# Altium footprint library North POLE.PcbLib: 419 footprints (part 7 of 27)
Each footprint in its own frame and in the unit in brackets; x right, y up, seen from the top. Pads: shape width x height; smd on the part's side, far side on the other; paste and mask are expansions set on the pad; w line width, h text height; cw(c..) or ccw(c..) is an arc to the next point about the centre after c.
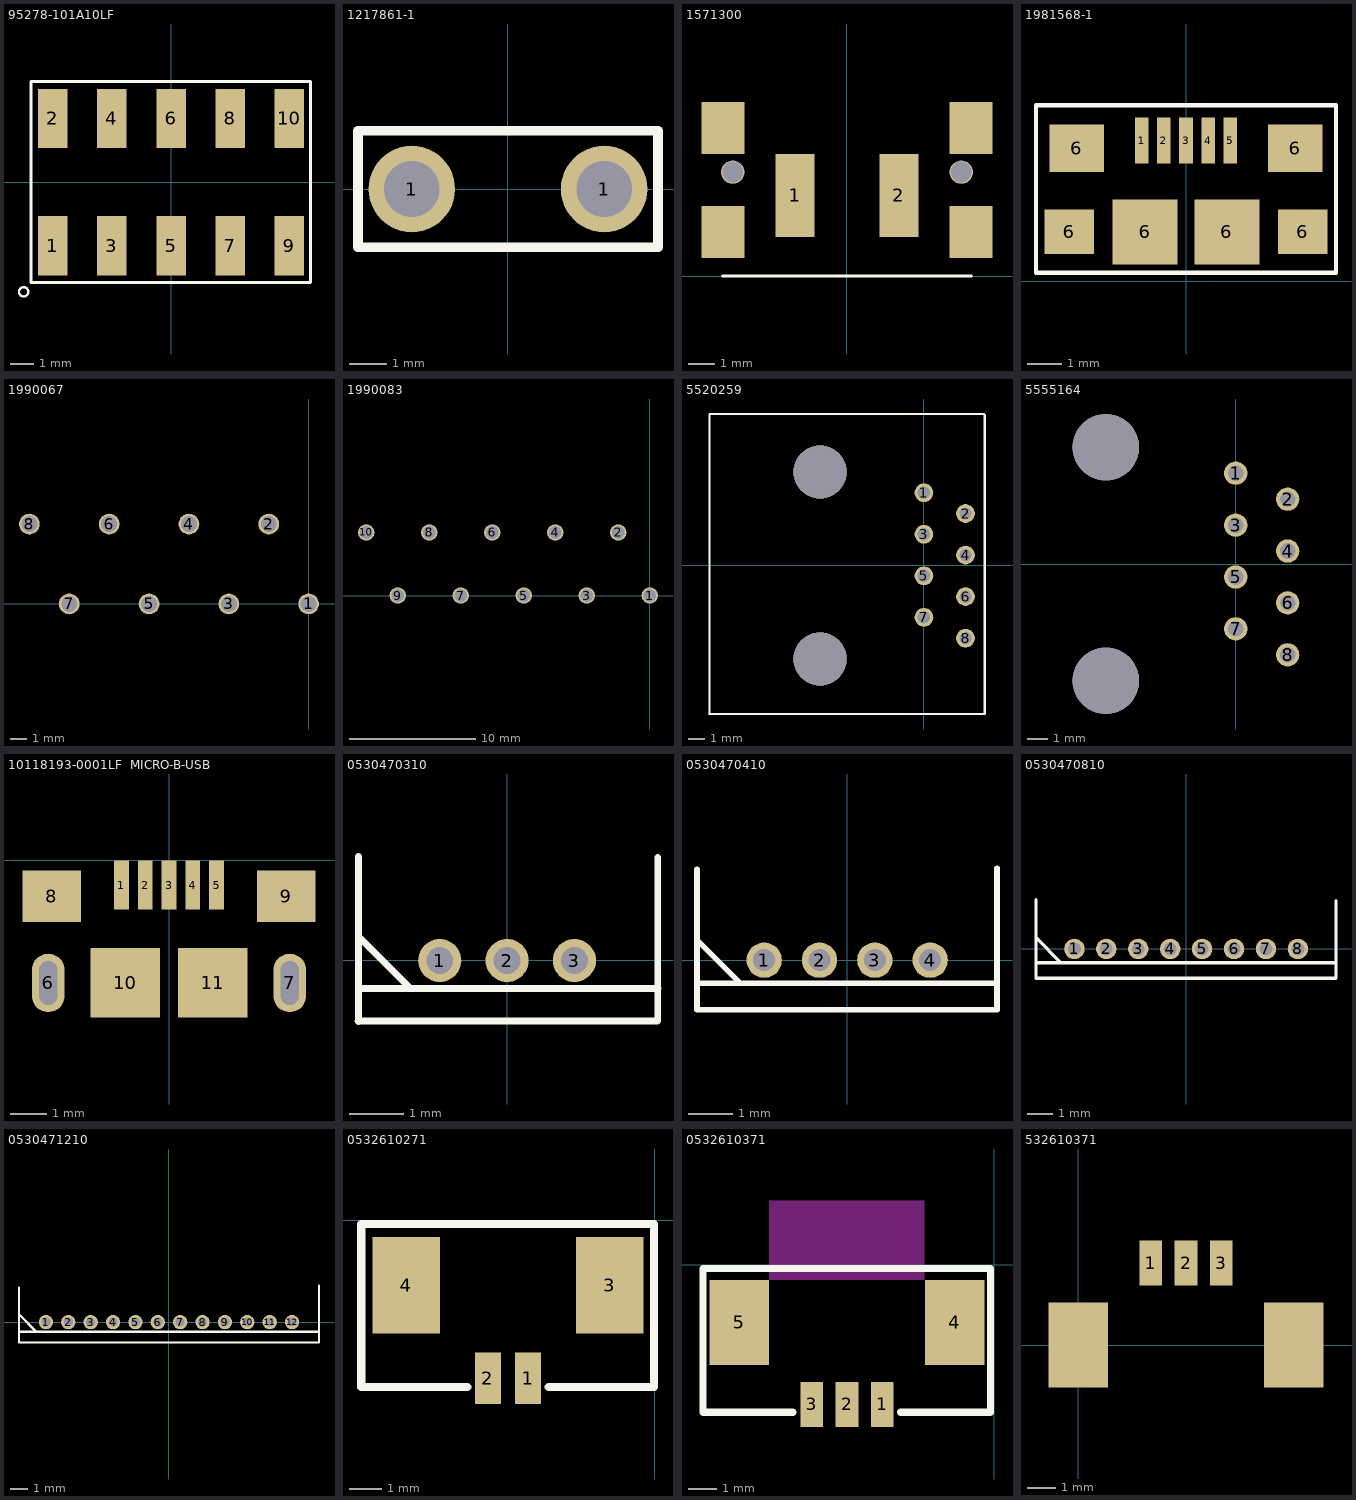
[diagram p6: the footprints below, top view; thin cyan lines are the x and y axes]

## 95278-101A10LF [mm]
pads (10):
  rect 1.27x2.54 smd: 1(-5.08,-2.73) 2(-5.08,2.73) 3(-2.54,-2.73) 4(-2.54,2.73) 5(0,-2.73) 6(0,2.73) 7(2.54,-2.73) 8(2.54,2.73) 9(5.08,-2.73) 10(5.08,2.73)
Top Overlay:
  lines w0.1: -6.161,-4.598 ccw(c-6.327,-4.71) -6.147,-4.623
  lines w0.127: -6.02,-4.318 -6.02,4.318 5.994,4.318 5.994,-4.318 -6.02,-4.318
3D body: height 9.66, standoff 0, extent -6.35,-3.505 6.35,3.495

## 1217861-1 [mil] "PCB mounted battery connection"
pads (2):
  round 90 hole 58: 1(-100,0) 1(100,0)
Top Overlay:
  lines w10: -155.99,-60.75 156.01,-60.75 156.01,60.75 -155.99,60.75 -155.99,-60.75
3D body: height 410, standoff -142, extent -155.99,-60.75 156.01,60.75

## 1571300 [mm]
pads (8):
  rect 1.5x3.2 smd: 1(-2,3.101) 2(2,3.101)
  rect 1.65x2 smd: ""(-4.775,1.7) ""(-4.775,5.7) ""(4.775,1.7) ""(4.775,5.7)
  round 0.9 hole 0.8 mask+0.05: ""(-4.4,4) ""(4.4,4)
Top Overlay:
  lines w0.127: -4.787,0 4.789,0
3D body: height 8.1, standoff -0.5, extent -4.862,-2.711 4.838,5.489

## 1981568-1 [mm]
pads (11):
  rect 0.4x1.35 smd: 1(-1.3,4.125) 2(-0.65,4.125) 3(0,4.125) 4(0.65,4.125) 5(1.3,4.125)
  rect 1.45x1.3 smd: 6(-3.425,1.45) 6(3.425,1.45)
  rect 1.6x1.4 smd: 6(-3.2,3.9) 6(3.2,3.9)
  rect 1.9x1.9 smd: 6(-1.2,1.45) 6(1.2,1.45)
Top Overlay:
  lines w0.127: -4.4,0.254 -4.4,5.162 4.4,5.162 4.4,0.254 -4.4,0.254
3D body: height 2.79, standoff -0.29, extent -4,-1.307 4,4.293

## 1990067 [mm]
pads (8):
  round 1.3 hole 1: 1(0,0) 2(-2.5,5) 3(-5,0) 4(-7.5,5) 5(-10,0) 6(-12.5,5) 7(-15,0) 8(-17.5,5)
3D body: height 13.1, standoff 0, extent -1.252,-5.062 1.252,7.531
3D body: height 13.1, standoff 0, extent -6.252,-5.062 -3.748,7.531
3D body: height 13.1, standoff 0, extent -11.252,-5.062 -8.748,7.531
3D body: height 13.1, standoff 0, extent -16.252,-5.062 -13.748,7.531
3D body: height 13.1, standoff 0, extent -3.753,-5.061 -1.248,7.532
3D body: height 13.1, standoff 0, extent -8.753,-5.061 -6.248,7.532
3D body: height 13.1, standoff 0, extent -13.753,-5.061 -11.248,7.532
3D body: height 13.1, standoff 0, extent -18.753,-5.061 -16.248,7.532

## 1990083 [mm]
pads (10):
  round 1.3 hole 1: 1(0,0) 2(-2.5,5) 3(-5,0) 4(-7.5,5) 5(-10,0) 6(-12.5,5) 7(-15,0) 8(-17.5,5) 9(-20,0) 10(-22.5,5)
3D body: height 13.1, standoff 0, extent -23.753,-5.061 -21.248,7.532
3D body: height 13.1, standoff 0, extent -18.753,-5.061 -16.248,7.532
3D body: height 13.1, standoff 0, extent -13.753,-5.061 -11.248,7.532
3D body: height 13.1, standoff 0, extent -8.753,-5.061 -6.248,7.532
3D body: height 13.1, standoff 0, extent -3.753,-5.061 -1.248,7.532
3D body: height 13.1, standoff 0, extent -21.252,-5.062 -18.748,7.531
3D body: height 13.1, standoff 0, extent -16.252,-5.062 -13.748,7.531
3D body: height 13.1, standoff 0, extent -11.252,-5.062 -8.748,7.531
3D body: height 13.1, standoff 0, extent -6.252,-5.062 -3.748,7.531
3D body: height 13.1, standoff 0, extent -1.252,-5.062 1.252,7.531

## 5520259 [mil]
pads (10):
  round 45 hole 30: 1(0,175) 2(100,125) 3(0,75) 4(100,25) 5(0,-25) 6(100,-75) 7(0,-125) 8(100,-175)
  round 128 hole 128 unplated: ""(-250,-225) ""(-250,225)
Top Overlay:
  lines w5: -516.8,-357.6 146.3,-357.6 146.3,362 143.8,364.5 -516.5,364.5 -516.5,-357.3 -516.8,-357.6
3D body: height 649.61, standoff -130.39, extent -509.69,-351.6 140.3,358.4

## 5555164 [mil]
pads (10):
  round 45 hole 30: 1(0,175) 2(100,125) 3(0,75) 4(100,25) 5(0,-25) 6(100,-75) 7(0,-125) 8(100,-175)
  round 128 hole 128 unplated: ""(-250,-225) ""(-250,225)
3D body: height 483.72, standoff -161.28, extent -566,-302.7 149,300.3

## 10118193-0001LF  MICRO-B-USB [mm]
pads (11):
  rect 0.4x1.35 smd mask+0.08: 1(-1.3,-0.675) 2(-0.65,-0.675) 3(0,-0.675) 4(0.65,-0.675) 5(1.3,-0.675)
  rrect100% 0.9x1.6 hole 0.5 slot 1.2 at 90 deg mask+0: 6(-3.3,-3.35) 7(3.3,-3.35)
  rect 1.6x1.4 smd mask+0.08: 8(-3.2,-0.98) 9(3.2,-0.98)
  rect 1.9x1.9 smd mask+0.08: 10(-1.2,-3.35) 11(1.2,-3.35)
3D body: height 2.86, standoff -0.74, extent -3.928,-6.091 3.928,-0.43

## 0530470310 [mm]
pads (3):
  round 0.8 hole 0.5 mask+0.08: 1(-1.25,0) 2(0,0) 3(1.25,0)
Top Overlay:
  lines w0.127: -2.768,-1.122 2.791,-1.122 ; -2.763,-0.523 2.801,-0.523 ; -2.758,-1.132 -2.758,-0.535 -2.758,1.93 ; -2.735,0.42 -1.806,-0.509 ; 2.795,-1.099 2.795,-0.426 2.795,1.91
3D body: height 4.2, standoff -2.2, extent -2.758,-1.132 2.742,2.068

## 0530470410 [mm]
pads (4):
  round 0.8 hole 0.5 mask+0.08: 1(-1.875,0) 2(-0.625,0) 3(0.625,0) 4(1.875,0)
Top Overlay:
  lines w0.127: -3.393,2.05 -3.393,-1.122 3.385,-1.122 3.385,2.078 ; -3.388,-0.523 3.363,-0.523 ; -3.36,0.42 -2.431,-0.509
3D body: height 4.2, standoff -2.2, extent -3.375,-1.117 3.375,2.083

## 0530470810 [mm]
pads (8):
  round 0.8 hole 0.5 mask+0.08: 1(-4.375,0) 2(-3.125,0) 3(-1.875,0) 4(-0.625,0) 5(0.625,0) 6(1.875,0) 7(3.125,0) 8(4.375,0)
Top Overlay:
  lines w0.127: -5.879,-1.142 5.865,-1.142 ; -5.877,-1.14 -5.877,-0.543 ; -5.877,1.922 -5.877,-0.543 ; -5.861,0.412 -5.854,0.412 -4.925,-0.517 ; 5.867,-1.14 5.867,-0.543 ; 5.867,1.897 5.867,-0.543 ; -5.877,-0.543 5.867,-0.543
3D body: height 4.2, standoff -2.2, extent -5.879,-1.142 5.871,2.058

## 0530471210 [mm]
pads (12):
  round 0.8 hole 0.5 mask+0.08: 1(-6.875,0) 2(-5.625,0) 3(-4.375,0) 4(-3.125,0) 5(-1.875,0) 6(-0.625,0) 7(0.625,0) 8(1.875,0) 9(3.125,0) 10(4.375,0) 11(5.625,0) 12(6.875,0)
Top Overlay:
  lines w0.127: -8.379,-1.142 8.382,-1.142 8.382,2.052 ; -8.377,-1.14 -8.377,-0.543 ; -8.377,1.922 -8.377,-0.543 ; -8.361,0.412 -8.354,0.412 -7.425,-0.517 ; 8.357,-0.543 -8.377,-0.543
3D body: height 4.2, standoff -2.2, extent -8.375,-1.143 8.375,2.057

## 0532610271 [mm]
pads (4):
  rect 0.8x1.6 smd paste-0.05 mask+0.1: 1(-3.947,-4.932) 2(-5.197,-4.932)
  rect 2.1x3 smd paste-0.05 mask+0.1: 3(-1.397,-2.032) 4(-7.747,-2.032)
Top Overlay:
  lines w0.254: -5.842,-5.207 -9.144,-5.207 -9.144,-0.127 -0.025,-0.127 -0.025,-5.207 -3.302,-5.207
3D body: height 3.4, standoff 0, extent -8.397,-5.259 -0.747,-0.059

## 0532610371 [mm]
pads (5):
  rect 0.8x1.6 smd paste-0.05 mask+0.1: 1(-3.947,-4.932) 2(-5.197,-4.932) 3(-6.447,-4.932)
  rect 2.1x3 smd paste-0.05 mask+0.1: 4(-1.397,-2.032) 5(-8.997,-2.032)
Top Overlay:
  lines w0.254: -7.112,-5.207 -10.287,-5.207 -10.287,-0.127 -0.127,-0.127 -0.127,-5.207 -3.302,-5.207
Keep-Out Layer:
  region: -7.95,-0.533 -7.95,2.261 -2.464,2.261 -2.464,-0.533
3D body: height 3.4, standoff 0, extent -9.666,-5.27 -0.766,-0.07

## 532610371 [mm]
pads (5):
  rect 0.8x1.6 smd mask+0.08: 1(2.55,2.9) 2(3.8,2.9) 3(5.05,2.9)
  rect 2.1x3 smd mask+0.08: ""(0,0) ""(7.6,0)
3D body: height 3.35, standoff -0.05, extent -0.635,-1.795 8.265,3.405